# Altium footprint library Power_DiscreteSSR1.PcbLib: 45 footprints (part 1 of 3)
Each footprint in its own frame and in the unit in brackets; x right, y up, seen from the top. Pads: shape width x height; smd on the part's side, far side on the other; paste and mask are expansions set on the pad; w line width, h text height; cw(c..) or ccw(c..) is an arc to the next point about the centre after c.
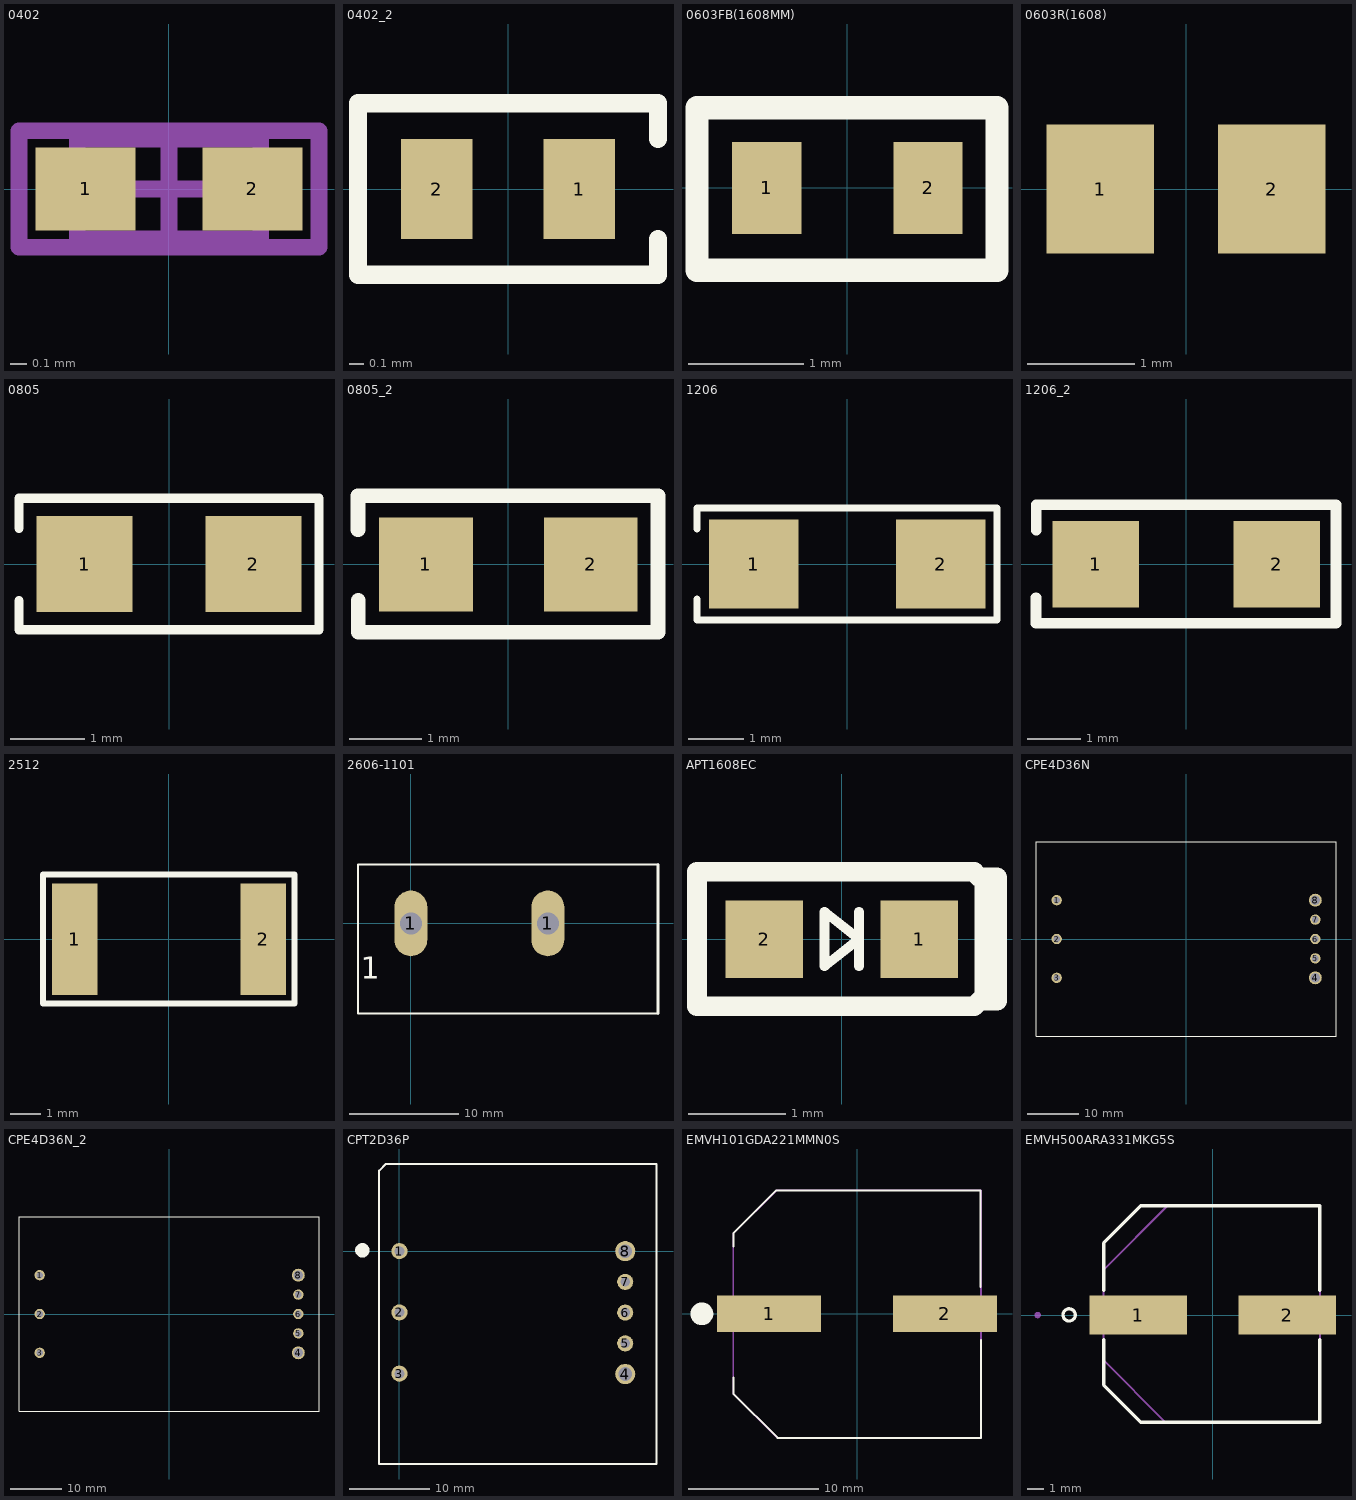
[diagram p0: the footprints below, top view; thin cyan lines are the x and y axes]

## 0402 [mm] "Chip Capacitor, Body 1.0x0.5mm, IPC High Density"
height 1.3
pads (2):
  rect 0.6x0.5 smd: 1(-0.5,0) 2(0.5,0)
Mechanical 13:
  lines w0.1: -0.55,-0.3 0.55,-0.3 0.55,0.3 -0.55,0.3 -0.55,-0.3
Mechanical 15:
  lines w0.1: -0.3,0 0.3,0 ; 0,-0.3 0,0.3 ; -0.9,-0.35 0.9,-0.35 0.9,0.35 -0.9,0.35 -0.9,-0.35
3D body: height 1.3, standoff 0, extent -0.55,-0.3 0.55,0.3

## 0402_2 [mm]
pads (2):
  rect 0.5x0.7 smd: 1(0.5,0) 2(-0.5,0)
Top Overlay:
  lines w0.127: 0.83,-0.6 1.05,-0.6 ; 0.83,0.6 1.05,0.6 ; 1.05,-0.35 1.05,-0.6 ; 1.05,0.35 1.05,0.6 ; 1.05,-0.6 -1.05,-0.6 -1.05,0.6 1.05,0.6
3D body: height 0.2, standoff 0, extent -0.4,-0.3 0.4,0.3
3D body: height 0.2, standoff 0, extent -0.6,-0.3 -0.4,0.3
3D body: height 0.2, standoff 0, extent 0.4,-0.3 0.6,0.3

## 0603FB(1608MM) [mm]
pads (2):
  rect 0.6x0.8 smd: 1(-0.7,0) 2(0.7,0)
Top Overlay:
  lines w0.203: -1.304,-0.712 1.298,-0.712 1.298,0.694 -1.304,0.694 -1.304,-0.712
3D body: height 0.9, standoff 0.1, extent 0.45,-0.4 0.8,0.4
3D body: height 0.9, standoff 0.1, extent -0.8,-0.4 -0.45,0.4
3D body: height 0.9, standoff 0.1, extent -0.45,-0.4 0.45,0.4

## 0603R(1608) [mm]
pads (2):
  rect 1x1.2 smd: 1(-0.8,0) 2(0.8,0)
3D body: height 0.9, standoff 0.1, extent -0.45,-0.4 0.45,0.4
3D body: height 0.9, standoff 0.1, extent -0.8,-0.4 -0.45,0.4
3D body: height 0.9, standoff 0.1, extent 0.45,-0.4 0.8,0.4

## 0805 [mm]
pads (2):
  rect 1.3x1.3 smd: 1(-1.143,0) 2(1.143,0)
Top Overlay:
  lines w0.127: -2.032,-0.495 -2.032,-0.889 2.032,-0.889 2.032,0.889 -2.032,0.889 ; -2.032,0.483 -2.032,0.876
3D body "User Library-0805 SMD Capacitor.step": height 0.78, standoff 0, extent -1,-0.625 1,0.625

## 0805_2 [mm]
pads (2):
  rect 1.3x1.3 smd: 1(-1.143,0) 2(1.143,0)
Top Overlay:
  lines w0.203: -2.086,0.483 -2.086,0.954 2.076,0.954 2.076,-0.942 -2.084,-0.942 -2.084,-0.495
3D body "User Library-0805 SMD Capacitor.step": height 0.78, standoff 0, extent -1,-0.625 1,0.625

## 1206 [mil]
pads (2):
  rect 64x64 smd: 1(-67,0) 2(67,0)
Top Overlay:
  lines w5: -107.5,-40 -107.5,-25 ; -107.5,25 -107.5,40 ; -107.09,-40 107.09,-40 107.09,40 -107.09,40
3D body "User Library-1206 SMD Capacitor.step": height 39.45, standoff 0, extent -62.01,-31.5 63.98,31.5

## 1206_2 [mil]
pads (2):
  rect 64x64 smd: 1(-67,0) 2(67,0)
Top Overlay:
  lines w8: -111.09,-25 -111.09,-43.74 110.97,-43.74 110.97,43.84 -110.97,43.84 -110.97,25
3D body "User Library-1206 SMD Capacitor.step": height 39.45, standoff 0, extent -62.01,-31.5 63.98,31.5

## 2512 [mm]
height 0.508
pads (2):
  rect 1.5x3.7 smd: 1(-3.125,0) 2(3.125,0)
Top Overlay:
  lines w0.203: -4.176,-2.139 -4.176,2.151 4.164,2.151 4.164,-2.139 -4.176,-2.139
3D body "User Library-res2512_body.STEP": height 0.62, standoff 0, extent -3.2,-1.6 3.119,1.6

## 2606-1101 [mm] "PCB terminal block, lever 6 mm² Pin spacing 7.5 mm 1-pole, gray"
pads (2):
  oval 3x6 hole 2: 1(0,0) 1(12.5,0)
Top Overlay:
  lines w0.2: 22.555,-8.23 -4.826,-8.23 -4.826,5.385 22.555,5.385
  lines w0.254: 22.555,-8.23 22.555,5.385
  text "1" at -4.572,-5.055 h2
3D body "2606-1101.stp": height 24, standoff -4, extent -2,-6.85 22.3,3.5

## APT1608EC [mm]
pads (2):
  rect 0.8x0.8 smd: 1(0.8,0) 2(-0.8,0)
Top Overlay:
  lines w0.102: 0.178,-0.279 0.178,0.282 ; -0.178,-0.279 -0.178,0.282 ; -0.178,-0.279 -0.178,0.282 ; -0.178,-0.279 0.178,0.001 -0.178,0.282
  lines w0.203: 1.422,0.635 1.364,0.693 -1.491,0.693 -1.491,-0.69 1.367,-0.69 1.473,-0.585 1.473,0.635 1.6,0.635 1.6,-0.635 1.47,-0.635 1.47,0.635 1.511,0.635 1.511,-0.635
3D body "APT1608.STEP": height 0.72, standoff -0.03, extent -0.801,-0.4 0.81,0.4

## CPE4D36N [mil] "24V 4A 18-72VIN 8TH NEG ENB"
pads (8):
  round 80 hole 52: 1(-1000,300) 2(-1000,0) 3(-1000,-300) 5(1000,-150) 6(1000,0) 7(1000,150)
  round 100 hole 72: 4(1000,-300) 8(1000,300)
Top Overlay:
  lines w5: -1160,-752 -1160,752 1160,752 1160,-752 -1160,-752
3D body: height 62.99, standoff 0, extent -1159.45,-460.63 1159.45,460.63
3D body: height 500, standoff 0, extent 279,-121 806,351
3D body: height 314.96, standoff 0, extent -404,-400 24,417
3D body: height 236.22, standoff 0, extent -1160,-202 -806,0
3D body: height 118.11, standoff 0, extent 258,-360 492,-233
3D body: height 118.11, standoff 0, extent -851,131 -576,307
3D body: height 118.11, standoff 0, extent -708,-368 -531,-282
3D body: height 118.11, standoff 0, extent -673.5,-153 -617,-87
3D body: height 118.11, standoff 0, extent -851,-368.5 -785,-312
3D body: height 118.11, standoff 0, extent 650.5,-398.24 755,-332
3D body: height 118.11, standoff 0, extent 755,-247.5 821,-191

## CPE4D36N_2 [mil]
pads (8):
  round 80 hole 52: 1(-1000,300) 2(-1000,0) 3(-1000,-300) 5(1000,-150) 6(1000,0) 7(1000,150)
  round 100 hole 72: 4(1000,-300) 8(1000,300)
Top Overlay:
  lines w5: -1160,-752 1160,-752 1160,752 -1160,752 -1160,-752
3D body: height 118.11, standoff 0, extent 755,-247.5 821,-191
3D body: height 118.11, standoff 0, extent 650.5,-398.24 755,-332
3D body: height 118.11, standoff 0, extent -851,-368.5 -785,-312
3D body: height 118.11, standoff 0, extent -673.5,-153 -617,-87
3D body: height 118.11, standoff 0, extent -708,-368 -531,-282
3D body: height 118.11, standoff 0, extent -851,131 -576,307
3D body: height 118.11, standoff 0, extent 258,-360 492,-233
3D body: height 236.22, standoff 0, extent -1160,-202 -806,0
3D body: height 314.96, standoff 0, extent -404,-400 24,417
3D body: height 500, standoff 0, extent 279,-121 806,351
3D body: height 62.99, standoff 0, extent -1159.45,-460.63 1159.45,460.63

## CPT2D36P [mm] "DC DC CONVERTER 72W"
pads (8):
  round 2 hole 1.2: 1(0,0) 2(0,-7.6) 3(0,-15.2) 5(28,-11.43) 6(28,-7.62) 7(28,-3.81)
  round 2.5 hole 1.7: 4(28,-15.24) 8(28,0)
Top Overlay:
  circle w1.016: c-4.6,0.1 r0.381
  lines w0.254: -2.531,-26.4 31.9,-26.4 31.9,10.805 -1.695,10.805 -2.531,9.969 -2.531,-26.4
3D body "I7C4W008A120V-001-R--3DModel-STEP-1.STEP": height 12.09, standoff -4.57, extent -2.54,-26.086 31.496,10.744

## EMVH101GDA221MMN0S [mm]
pads (2):
  rect 8x2.8 smd: 1(-6.75,0) 2(6.75,0)
Top Overlay:
  circle w1: c-11.913,0 r0.376
  lines w0.152: -9.5,-4.877 -9.5,-6.121 -6.096,-9.525 9.525,-9.525 9.525,-2.007 ; -9.5,5.182 -9.5,6.172 -6.198,9.474 9.5,9.474 9.5,2.057
Mechanical 13:
  circle w0.2: c-11.506,0.025 r0.1
  lines w0.127: -9.5,-6.147 -9.5,6.172 -6.172,9.5 9.525,9.5 9.525,-9.525 -6.121,-9.525 -9.5,-6.147
3D body: height 3, standoff 0, extent -9.525,-9.525 9.525,9.5
3D body: height 21.5, standoff 0, extent -9.025,-9.022 8.975,8.972

## EMVH500ARA331MKG5S [mm]
pads (2):
  rect 6x2.42 smd: 1(-4.6,0) 2(4.6,0)
Top Overlay:
  circle w0.2: c-8.857,0.007 r0.376
  lines w0.203: -6.731,-1.53 -6.731,-4.318 -4.445,-6.604 6.604,-6.604 6.604,-1.53 ; -6.731,1.53 -6.731,4.445 -4.445,6.731 6.604,6.731 6.604,1.53
Mechanical 13:
  circle w0.2: c-10.8,0 r0.1
  lines w0.127: -6.731,-2.794 -2.921,-6.604 6.604,-6.604 6.604,6.731 -2.794,6.731 -6.731,2.794 -6.731,-2.794
3D body "CAP_EEFK_H13_PAN.step": height 14.05, standoff 0, extent -7.506,-6.819 7.506,6.871